# Altium footprint library ESKDPcbLib.PcbLib: 608 footprints (part 2 of 38)
Each footprint in its own frame and in the unit in brackets; x right, y up, seen from the top. Pads: shape width x height; smd on the part's side, far side on the other; paste and mask are expansions set on the pad; w line width, h text height; cw(c..) or ccw(c..) is an arc to the next point about the centre after c.
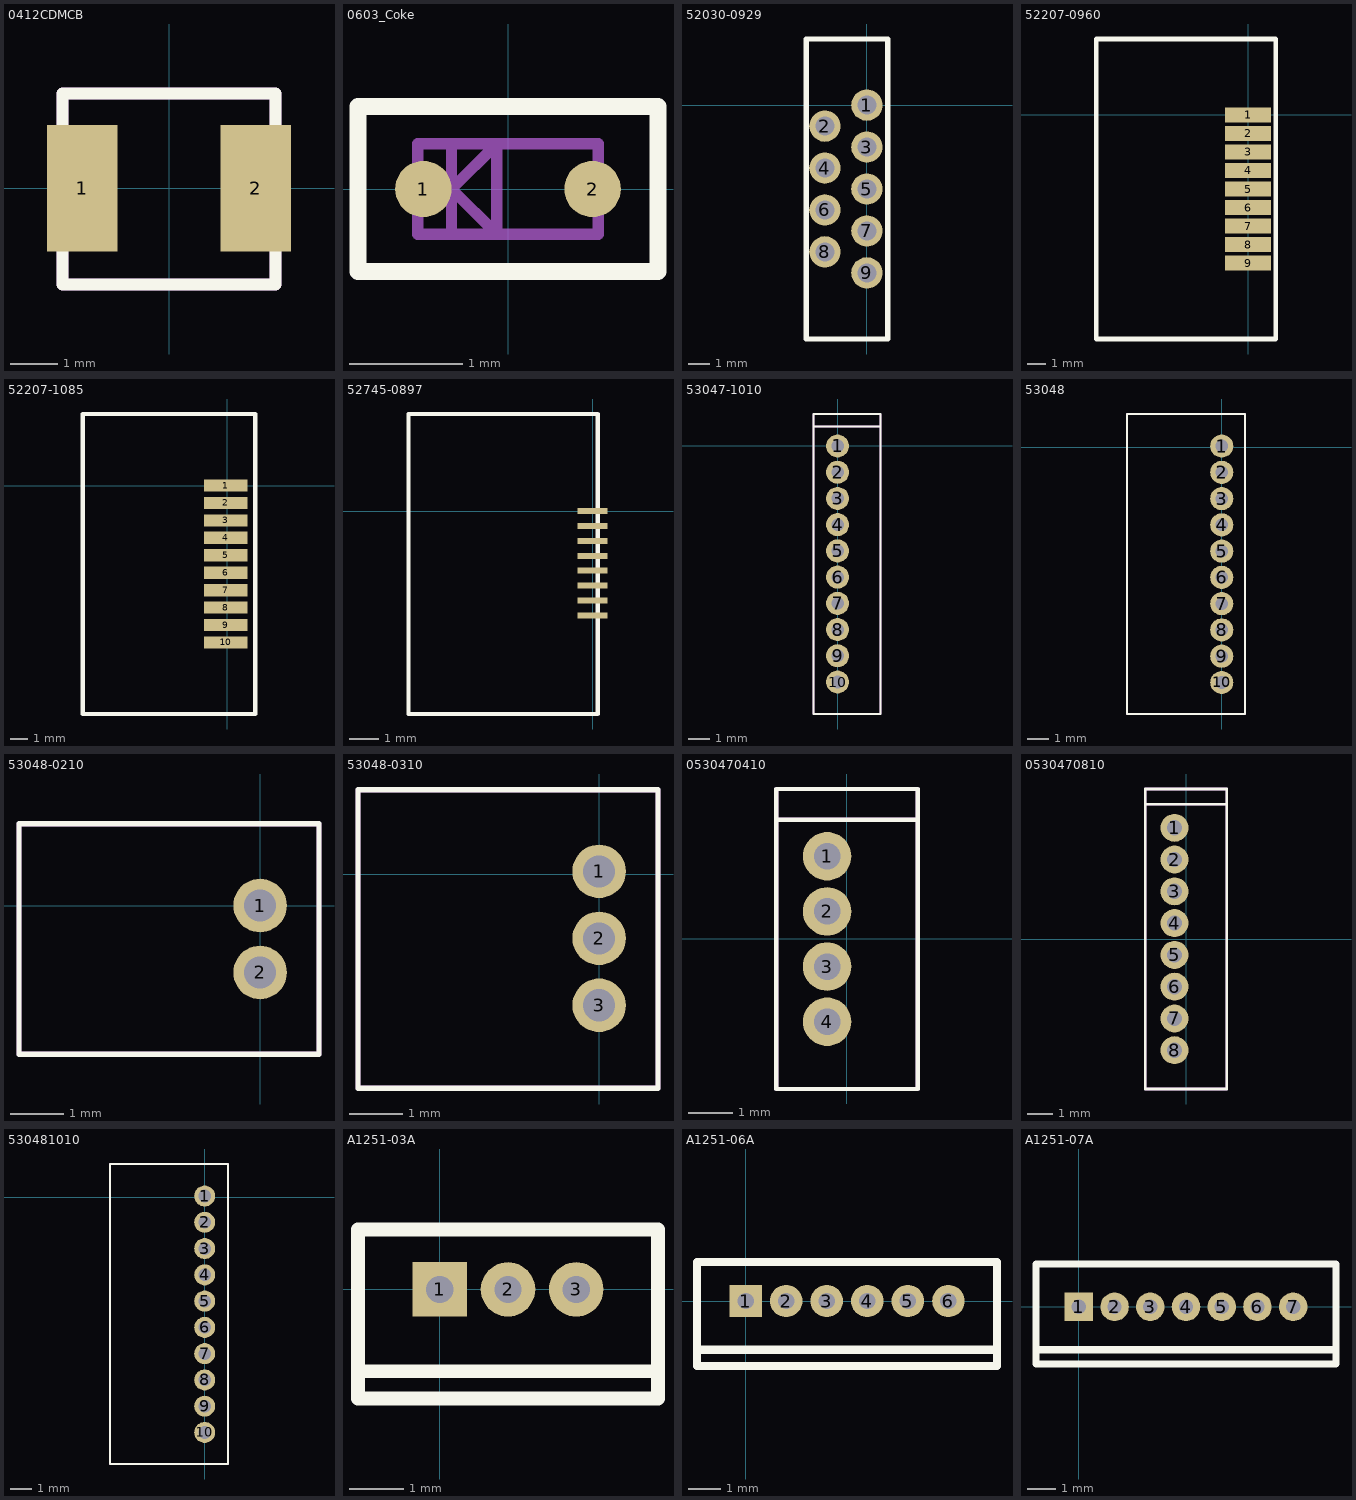
[diagram p1: the footprints below, top view; thin cyan lines are the x and y axes]

## 0412CDMCB [mm]
pads (2):
  rect 1.5x2.7 smd: 1(-1.85,0) 2(1.85,0)
Top Overlay:
  lines w0.254: -2.275,-2.05 2.275,-2.05 2.275,2.025 -2.275,2.025 -2.275,-2.05
Mechanical 7:
  lines w0.254: -2.275,-2.05 2.275,-2.05 2.275,2.025 -2.275,2.025 -2.275,-2.05
Mechanical 10:
  text ".Designator" at 3.325,-0.075 h1.52
  text ".Comment" at 3.25,2.175 h1.52
3D body: height 1.2, standoff 0.05, extent -2.275,-2.05 2.275,2.025

## 0603_Coke [mm]
pads (2):
  round 0.5 smd: 1(-0.75,0) 2(0.75,0)
Top Overlay:
  lines w0.15: -1.33,-0.73 1.33,-0.73 1.33,0.73 -1.33,0.73 -1.33,-0.73
Mechanical 7:
  lines w0.1: -0.5,-0.4 -0.5,0.4 ; -0.8,-0.4 -0.8,0.4 0.8,0.4 0.8,-0.4 -0.8,-0.4 ; -0.5,0 -0.1,0.4 -0.1,-0.4 -0.5,0
Mechanical 10:
  text ".Designator" at -0.62,1 h0.8
  text ".Comment" at -0.75,-1.28 h0.6
3D body: height 0.9, standoff 0, extent -0.8,-0.4 0.8,0.4

## 52030-0929 [mm] "Molex"
pads (9):
  round 1.5 hole 0.9 mask+0: 1(0,0) 2(-2,-1) 3(0,-2) 4(-2,-3) 5(0,-4) 6(-2,-5) 7(0,-6) 8(-2,-7) 9(0,-8)
Top Overlay:
  lines w0.254: -2.9,-11.15 1,-11.15 1,3.15 -2.9,3.15 -2.9,-11.15
3D body: height 6.7, standoff -3.2, extent -2.7,-11.15 0.8,3.15

## 52207-0960 [mm]
pads (9):
  rect 2.5x0.8 smd mask+0: 1(0,0) 2(0,-1) 3(0,-2) 4(0,-3) 5(0,-4) 6(0,-5) 7(0,-6) 8(0,-7) 9(0,-8)
Top Overlay:
  lines w0.254: -8.2,-12.1 -8.2,4.1 1.5,4.1 1.5,-12.1 -8.2,-12.1
3D body: height 2.65, standoff -0.05, extent -7.9,-11.65 1,3.65

## 52207-1085 [mm]
pads (10):
  rect 2.5x0.7 smd mask+0: 1(-0.1,0) 2(-0.1,-1) 3(-0.1,-2) 4(-0.1,-3) 5(-0.1,-4) 6(-0.1,-5) 7(-0.1,-6) 8(-0.1,-7) 9(-0.1,-8) 10(-0.1,-9)
Top Overlay:
  lines w0.254: -8.3,-13.1 1.6,-13.1 1.6,4.1 -8.3,4.1 -8.3,-13.1
3D body: height 2.75, standoff 0.05, extent -8,-12.65 0.9,3.65

## 52745-0897 [mm]
pads (8):
  rect 1x0.2 smd mask+0: 1(0,0) 2(0,-0.5) 3(0,-1) 4(0,-1.5) 5(0,-2) 6(0,-2.5) 7(0,-3) 8(0,-3.5)
Top Overlay:
  lines w0.15: -6.18,-6.81 -6.18,3.26 0.18,3.26 0.18,-6.81 -6.18,-6.81
3D body: height 2, standoff 0, extent -6.18,-6.81 0.22,3.29

## 53047-1010 [mm]
pads (10):
  round 1.1 hole 0.6 mask+0: 1(0,0) 2(0,-1.25) 3(0,-2.5) 4(0,-3.75) 5(0,-5) 6(0,-6.25) 7(0,-7.5) 8(0,-8.75) 9(0,-10) 10(0,-11.25)
Top Overlay:
  lines w0.1: -1.15,0.925 2.05,0.925 ; -1.15,-12.775 -1.15,1.525 2.05,1.525 2.05,-12.775 -1.15,-12.775
Mechanical 7:
  lines w0.1: -1.15,0.925 2.05,0.925 ; -1.15,-12.775 2.05,-12.775 2.05,1.525 -1.15,1.525 -1.15,-12.775
3D body: height 4.1, standoff -2.3, extent -1.2,-12.725 2,1.525

## 53048 [mm]
pads (10):
  round 1.1 hole 0.6 mask+0: 1(0,0.05) 2(0,-1.2) 3(0,-2.45) 4(0,-3.7) 5(0,-4.95) 6(0,-6.2) 7(0,-7.45) 8(0,-8.7) 9(0,-9.95) 10(0,-11.2)
Top Overlay:
  lines w0.1: -4.5,-12.7 1.1,-12.7 1.1,1.575 -4.5,1.575 -4.5,-12.7
Mechanical 7:
  lines w0.1: -4.5,-12.7 -4.5,1.575 1.1,1.575 1.1,-12.7 -4.5,-12.7
3D body: height 1.75, standoff -4.05, extent -4.45,-12.625 1.05,1.625

## 53048-0210 [mm]
pads (2):
  round 1 hole 0.6 mask+0: 1(0,0) 2(0,-1.25)
Top Overlay:
  lines w0.1: -4.5,-2.775 1.1,-2.775 1.1,1.525 -4.5,1.525 -4.5,-2.775
Mechanical 7:
  lines w0.1: -4.5,-2.775 -4.5,1.525 1.1,1.525 1.1,-2.775 -4.5,-2.775
3D body: height 3.5, standoff -2.4, extent -4.45,-2.775 1.05,1.475

## 53048-0310 [mm]
pads (3):
  round 1 hole 0.6 mask+0: 1(0,0.05) 2(0,-1.2) 3(0,-2.45)
Top Overlay:
  lines w0.1: -4.5,-4 -4.5,1.575 1.1,1.575 1.1,-4 -4.5,-4
Mechanical 7:
  lines w0.1: -4.5,-4 1.1,-4 1.1,1.575 -4.5,1.575 -4.5,-4
3D body: height 3.55, standoff -2.25, extent -4.45,-3.95 1.05,1.55

## 0530470410 [mm]
pads (4):
  round 1.1 hole 0.6 mask+0: 1(-0.45,1.875) 2(-0.45,0.625) 3(-0.45,-0.625) 4(-0.45,-1.875)
Top Overlay:
  lines w0.1: -1.6,2.7 1.6,2.7 ; -1.6,-3.4 1.6,-3.4 1.6,3.4 -1.6,3.4 -1.6,-3.4
Mechanical 7:
  lines w0.1: -1.6,2.7 1.6,2.7 ; -1.6,-3.4 -1.6,3.4 1.6,3.4 1.6,-3.4 -1.6,-3.4
3D body: height 4.1, standoff -2.3, extent -1.6,-3.375 1.6,3.375

## 0530470810 [mm]
pads (8):
  round 1.1 hole 0.6 mask+0: 1(-0.45,4.375) 2(-0.45,3.125) 3(-0.45,1.875) 4(-0.45,0.625) 5(-0.45,-0.625) 6(-0.45,-1.875) 7(-0.45,-3.125) 8(-0.45,-4.375)
Top Overlay:
  lines w0.1: -1.6,5.3 1.6,5.3 ; -1.6,-5.9 -1.6,5.9 1.6,5.9 1.6,-5.9 -1.6,-5.9
Mechanical 7:
  lines w0.1: -1.6,5.3 1.6,5.3 ; -1.6,-5.9 1.6,-5.9 1.6,5.9 -1.6,5.9 -1.6,-5.9
3D body: height 4.1, standoff -2.3, extent -1.6,-5.875 1.6,5.875

## 530481010 [mm]
pads (10):
  round 1 hole 0.6 mask+0: 1(0,0.05) 2(0,-1.2) 3(0,-2.45) 4(0,-3.7) 5(0,-4.95) 6(0,-6.2) 7(0,-7.45) 8(0,-8.7) 9(0,-9.95) 10(0,-11.2)
Top Overlay:
  lines w0.1: -4.5,-12.7 -4.5,1.575 1.1,1.575 1.1,-12.7 -4.5,-12.7
Mechanical 7:
  lines w0.1: -4.5,-12.7 1.1,-12.7 1.1,1.575 -4.5,1.575 -4.5,-12.7
3D body: height 3.55, standoff -2.25, extent -4.45,-12.625 1.05,1.625

## A1251-03A [mm]
pads (3):
  rect 1x1 hole 0.5 mask+0: 1(0,0)
  round 1 hole 0.5 mask+0: 2(1.25,0) 3(2.5,0)
Top Overlay:
  lines w0.254: -1.5,-1.5 4,-1.5 ; -1.5,-2 4,-2 4,1.1 -1.5,1.1 -1.5,-2
3D body: height 4.1, standoff -2.3, extent -1.5,-2.1 4,1.1

## A1251-06A [mm]
pads (6):
  rect 1x1 hole 0.5 mask+0: 1(0,0)
  round 1 hole 0.5 mask+0: 2(1.25,0) 3(2.5,0) 4(3.75,0) 5(5,0) 6(6.25,0)
Top Overlay:
  lines w0.254: -1.5,-1.5 7.75,-1.5 ; -1.5,-2 -1.5,1.2 7.75,1.2 7.75,-2 -1.5,-2
3D body: height 4.1, standoff -2.3, extent -1.425,-2.1 7.825,1.1

## A1251-07A [mm]
pads (7):
  rect 1x1 hole 0.5 mask+0: 1(0,0)
  round 1 hole 0.5 mask+0: 2(1.25,0) 3(2.5,0) 4(3.75,0) 5(5,0) 6(6.25,0) 7(7.5,0)
Top Overlay:
  lines w0.254: -1.5,-1.5 9,-1.5 ; -1.5,-2 -1.5,1.5 9,1.5 9,-2 -1.5,-2
3D body: height 8, standoff 0, extent -1.5,-2 9,1.5